# Altium footprint library others.PcbLib: 50 footprints (part 1 of 4)
Each footprint in its own frame and in the unit in brackets; x right, y up, seen from the top. Pads: shape width x height; smd on the part's side, far side on the other; paste and mask are expansions set on the pad; w line width, h text height; cw(c..) or ccw(c..) is an arc to the next point about the centre after c.
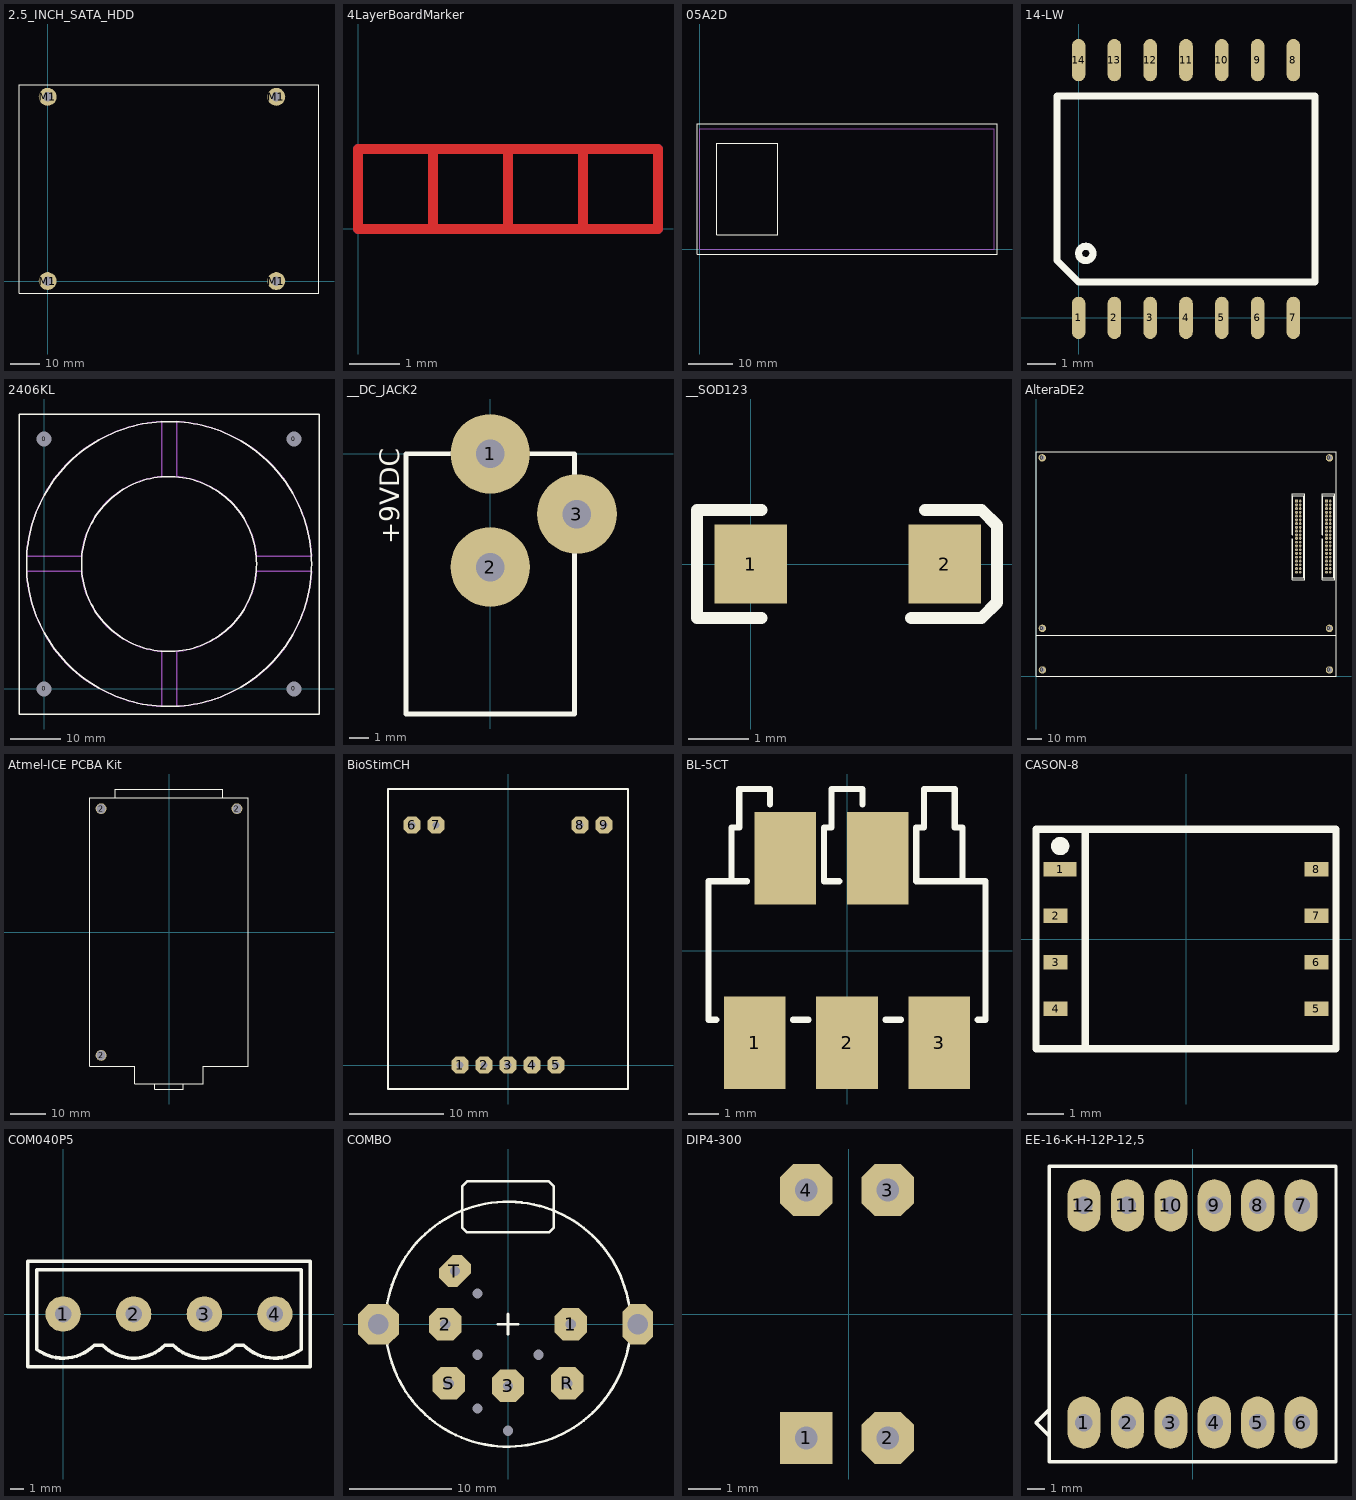
[diagram p0: the footprints below, top view; thin cyan lines are the x and y axes]

## 2.5_INCH_SATA_HDD [mm]
pads (4):
  round 6 hole 3.2: M1(0,0) M1(0,61.72) M1(76.6,0) M1(76.6,61.72)
Top Overlay:
  lines w0.2: -9.6,-4.1 -9.6,65.8 90.9,65.8 90.9,-4.1 -9.6,-4.1
3D body "HDD_SATA25.stp": height 10, standoff 0, extent -9.6,-4.065 90.9,65.785

## 4LayerBoardMarker [mm]
Component Side:
  lines w0.2: 1.5,0 1.5,1.6 ; 3,0 3,1.6 ; 4.5,0 4.5,1.6 ; 0,0 6,0 6,1.6 0,1.6 0,0
  text "1" at 0.6,0.3 h1
Inner Layer 1:
  lines w0.2: 1.5,0 1.5,1.6 ; 3,0 3,1.6 ; 4.5,0 4.5,1.6 ; 0,0 0,1.6 6,1.6 6,0 0,0
  text "2" at 1.9,0.3 h1
Inner Layer 2:
  lines w0.2: 1.5,0 1.5,1.6 ; 3,0 3,1.6 ; 4.5,0 4.5,1.6 ; 0,0 0,1.6 6,1.6 6,0 0,0
  text "3" at 3.4,0.3 h1
Solder Side:
  lines w0.2: 1.5,0 1.5,1.6 ; 3,0 3,1.6 ; 4.5,0 4.5,1.6 ; 0,0 0,1.6 6,1.6 6,0 0,0
  text "4" at 5.6,0.3 h1

## 05A2D [mm] "Delta Electronics 06A2D Power Entry Mounting Cutout"
Top Overlay:
  lines w0.254: -0.65,-1.1 -0.65,28.1 66.65,28.1 66.65,-1.1 -0.65,-1.1 ; 3.75,3.25 17.5,3.25 17.5,23.75 3.75,23.75 3.75,3.25
Mechanical 15:
  lines w0.254: 0,0 0,27 66,27 66,0 0,0
3D body "power entry module.STEP": height 5.58, standoff -33, extent -1.5,-1.1 67.418,28.1

## 14-LW [mm]
pads (14):
  oval 0.48x1.5 smd: 1(0,0) 2(1.27,0) 3(2.54,0) 4(3.81,0) 5(5.08,0) 6(6.35,0) 7(7.62,0) 8(7.62,9.144) 9(6.35,9.144) 10(5.08,9.144) 11(3.81,9.144) 12(2.54,9.144) 13(1.27,9.144) 14(0,9.144)
Top Overlay:
  circle w0.254: c0.254,2.286 r0.254
  lines w0.254: -0.762,2.032 0,1.27 8.382,1.27 8.382,7.874 -0.762,7.874 -0.762,2.032

## 2406KL [mm] "NMB TECHNOLOGIES DC Fan: 60mm x 60mm x 15mm"
pads (4):
  round 1.651 hole 3: 0(0,0) 0(0,50) 0(50,0) 0(50,50)
Top Overlay:
  circle w0.254: c25,25 r17.5
  circle w0.254: c25,25 r28.5
  lines w0.254: -5,-5 55,-5 55,55 -5,55 -5,-5
Mechanical 15:
  lines w0.254: -3.5,23.5 ccw(c25,25) 23.5,-3.5 23.5,7.5 cw(c25,25) 7.5,23.5 -3.5,23.5 ; -3.5,26.5 cw(c25,25) 23.5,53.5 23.5,42.5 ccw(c25,25) 7.5,26.5 -3.5,26.5 ; 26.5,-3.5 ccw(c25,25) 53.5,23.5 42.5,23.5 cw(c25,25) 26.5,7.5 26.5,-3.5 ; 26.5,42.5 cw(c25,25) 42.5,26.5 53.5,26.5 ccw(c25,25) 26.5,53.5 26.5,42.5
3D body "User Library-fan 60mm x 15mm hf.step": height -0.5, standoff -15.5, extent -5,-5 55,55

## __DC_JACK2 [mm]
pads (3):
  round 4.2 hole 1.5: 1(0,0) 2(0,-5.969) 3(4.572,-3.175)
Top Overlay:
  lines w0.254: -4.445,-13.716 4.445,-13.716 4.445,0 -4.445,0 -4.445,-13.716
  text "+9VDC" at -4.801,-4.775 h1.02
3D body "SW3dPS-kycon kld-0202-a.STEP": height 11.18, standoff -3.6, extent -4.699,-13.843 4.773,0.635

## __SOD123 [mm]
pads (2):
  rect 1.2x1.3 smd: 1(0,0) 2(3.2,0)
Top Overlay:
  lines w0.2: 0.174,-0.889 -0.889,-0.889 -0.889,0.889 0.174,0.889 ; 2.649,-0.889 3.81,-0.889 4.064,-0.635 4.064,0.635 3.81,0.889 2.874,0.889
3D body "SW3DPS-SOD123-DEFAULT.STEP": height 1.27, standoff 0, extent -0.326,-0.8 3.374,0.8

## AlteraDE2 [mm]
pads (86):
  round 5 hole 3.2: 0(4.191,148.082) 0(4.318,4.318) 0(4.318,32.512) 0(198.882,4.318) 0(198.882,32.512) 0(198.882,148.082)
  rect 1.9x1.9 hole 0.9: A1(176.53,118.745) B1(196.85,118.745)
  oct 1.9x1.9 hole 0.9: A2(179.07,118.745) A3(176.53,116.205) A4(179.07,116.205) A5(176.53,113.665) A6(179.07,113.665) A7(176.53,111.125) A8(179.07,111.125) A9(176.53,108.585) A10(179.07,108.585) A11(176.53,106.045) A12(179.07,106.045) A13(176.53,103.505) A14(179.07,103.505) A15(176.53,100.965) A16(179.07,100.965) A17(176.53,98.425) A18(179.07,98.425) A19(176.53,95.885) A20(179.07,95.885) A21(176.53,93.472) A22(179.07,93.472) A23(176.53,90.932) A24(179.07,90.932) A25(176.53,88.392) A26(179.07,88.392) A27(176.53,85.852) A28(179.07,85.852) A29(176.53,83.312) A30(179.07,83.312) A31(176.53,80.645) A32(179.07,80.645) A33(176.53,78.105) A34(179.07,78.105) A35(176.53,75.565) A36(179.07,75.565) A37(176.53,73.025) A38(179.07,73.025) A39(176.53,70.485) A40(179.07,70.485) B2(199.39,118.745) B3(196.85,116.205) B4(199.39,116.205) B5(196.85,113.665) B6(199.39,113.665) B7(196.85,111.125) B8(199.39,111.125) B9(196.85,108.585) B10(199.39,108.585) B11(196.85,106.045) B12(199.39,106.045) B13(196.85,103.505) B14(199.39,103.505) B15(196.85,100.965) B16(199.39,100.965) B17(196.85,98.425) B18(199.39,98.425) B19(196.85,95.885) B20(199.39,95.885) B21(196.85,93.472) B22(199.39,93.472) B23(196.85,90.932) B24(199.39,90.932) B25(196.85,88.392) B26(199.39,88.392) B27(196.85,85.852) B28(199.39,85.852) B29(196.85,83.312) B30(199.39,83.312) B31(196.85,80.645) B32(199.39,80.645) B33(196.85,78.105) B34(199.39,78.105) B35(196.85,75.565) B36(199.39,75.565) B37(196.85,73.025) B38(199.39,73.025) B39(196.85,70.485) B40(199.39,70.485)
Top Overlay:
  lines w0.102: 173.63,65.405 173.63,93.345 174.13,93.345 174.13,66.675 181.53,66.675 181.53,122.555 174.13,122.555 174.13,95.885 173.63,95.885 173.63,123.825 182.03,123.825 182.03,65.405 173.63,65.405 ; 193.95,65.405 193.95,93.345 194.45,93.345 194.45,66.675 201.85,66.675 201.85,122.555 194.45,122.555 194.45,95.885 193.95,95.885 193.95,123.825 202.35,123.825 202.35,65.405 193.95,65.405
  lines w0.254: 0,27.94 203.073,27.94 203.327,27.94 ; 0,0 203.2,0 203.327,0.127 203.327,152.146 203.2,152.273 0,152.273 0,0

## Atmel-ICE PCBA Kit [mm] "Atmel-ICE PCBA Kit"
pads (3):
  round 3 hole 2.6: 2(-19,-34.5) 2(-19,34.5) 2(19,34.5)
Top Overlay:
  lines w0.2: -15,37.5 -15,40 15,40 15,37.5 ; -4,-42.5 -4,-43.9 4,-43.9 4,-42.5 ; 9.6,-39.5 9.6,-37.5 22.1,-37.5 22.1,37.5 -22.1,37.5 -22.1,-37.5 -9.6,-37.5 -9.6,-42.5 9.6,-42.5 9.6,-39.4

## BioStimCH [mm]
pads (9):
  oct 1.8x1.8 hole 0.762: 1(-5.08,0) 2(-2.54,0) 3(0,0) 4(2.54,0) 5(5.08,0) 6(-10.16,25.4) 7(-7.62,25.4) 8(7.62,25.4) 9(10.16,25.4)
Top Overlay:
  lines w0.254: -12.7,-2.54 12.7,-2.54 12.7,29.21 -12.7,29.21 -12.7,-2.54

## BL-5CT [mm]
pads (5):
  rect 2x3 smd: 1(-3,-3) 2(0,-3) 3(3,-3) ""(-2,3) ""(1,3)
Top Overlay:
  lines w0.2: -4.25,-2.25 -4.5,-2.25 -4.5,2.25 -3.25,2.25 ; -3.75,2.25 -3.75,4 -3.5,4 -3.5,5.25 -2.5,5.25 -2.5,4.75 ; -1.75,-2.25 -1.25,-2.25 ; -0.25,2.25 -0.75,2.25 -0.75,4 -0.5,4 -0.5,5.25 0.5,5.25 0.5,4.75 ; 1.25,-2.25 1.75,-2.25 ; 3.75,2.25 3.75,4 3.5,4 3.5,5.25 2.5,5.25 2.5,4 2.25,4 2.25,2.25 4.5,2.25 4.5,-2.25 4.25,-2.25
3D body: height 7, standoff 0, extent -4.5,-2.25 4.5,2.25
3D body: height 5, standoff 0, extent -3.75,2.25 -2.25,5.25
3D body: height 5, standoff 0, extent -0.75,2.25 0.75,5.25
3D body: height 5, standoff 0, extent 2.25,2.25 3.75,5.25

## CASON-8 [mm] "CASON; 8-pad; Body Width 8 mm; Body Lenght 6 mm; Pitch 1.27 mm"
height 1
pads (8):
  rect 0.9x0.4 smd: 1(-3.44,1.905)
  rect 0.65x0.4 smd: 2(-3.565,0.635) 3(-3.565,-0.635) 4(-3.565,-1.905) 5(3.565,-1.905) 6(3.565,-0.635) 7(3.565,0.635) 8(3.565,1.905)
Top Overlay:
  circle w0.25: c-3.44,2.54 r0.125
  lines w0.2: -2.75,-3 -2.75,3 ; -4.1,-3 -4.1,3 4.1,3 4.1,-3 -4.1,-3

## COM040P5 [mm]
height 12.7
pads (4):
  round 2.54 hole 1.2: 1(0,0) 2(5.08,0) 3(10.16,0) 4(15.24,0)
Top Overlay:
  lines w0.254: -2.54,-3.81 -2.54,3.81 17.78,3.81 17.78,-3.81 -2.54,-3.81 ; -1.905,-2.54 ccw(c0,0) 2.245,-2.245 2.835,-2.245 ccw(c5.08,0) 7.325,-2.245 7.915,-2.245 ccw(c10.16,0) 12.405,-2.245 12.995,-2.245 ccw(c15.24,0) 17.145,-2.54 17.145,3.175 -1.905,3.175 -1.905,-2.54

## COMBO [mm] "COMB z Lucky600"
height 24
pads (13):
  oct 3.175x3.175 hole 1: 1(6.144,0.002) 2(-6.156,0.002) 3(-0.006,-6.048) R(5.794,-5.798) S(-5.806,-5.798)
  oct 0x0 hole 1: G(-0.006,-10.448) GN(-3.006,-8.248) RN(2.994,-2.998) SN(-3.006,-2.998)
  oct 2.54x3.175 hole 1 rot 135: T(-5.206,5.202)
  oct 0x0 hole 1 rot 135: TN(-3.006,3.002)
  oct 4x4 hole 2: ""(-12.706,0.002)
  oct 3x4 hole 2: ""(12.694,0.002)
Top Overlay:
  circle w0.254: c-0.006,0.002 r12
  lines w0.254: -1.006,0.002 0.994,0.002 ; -0.006,-0.998 -0.006,1.002 ; -4.506,9.502 -4.006,9.002 3.994,9.002 4.494,9.502 4.494,13.502 3.994,14.002 -4.006,14.002 -4.506,13.502 -4.506,9.502

## DIP4-300 [mm] "TH DIP4 300mil wide"
height 5
pads (4):
  rect 1.6x1.6 hole 0.7: 1(-1.3,-3.8)
  oct 1.6x1.6 hole 0.7: 2(1.2,-3.8) 3(1.2,3.8) 4(-1.3,3.8)

## EE-16-K-H-12P-12,5 [mm] "EE-16 transformer"
height 12.4
pads (12):
  oval 1.9x3 hole 1: 1(-6.25,-6.25) 2(-3.75,-6.25) 3(-1.25,-6.25) 4(1.25,-6.25) 5(3.75,-6.25) 6(6.25,-6.25) 7(6.25,6.25) 8(3.75,6.25) 9(1.25,6.25) 10(-1.25,6.25) 11(-3.75,6.25) 12(-6.25,6.25)
Top Overlay:
  lines w0.2: -8.25,-7 -9,-6.25 -8.25,-5.5 ; -8.25,-8.5 -8.25,8.5 8.25,8.5 8.25,-8.5 -8.25,-8.5